# Altium footprint library 二极管封装库.PcbLib: 222 footprints (part 6 of 14)
Each footprint in its own frame and in the unit in brackets; x right, y up, seen from the top. Pads: shape width x height; smd on the part's side, far side on the other; paste and mask are expansions set on the pad; w line width, h text height; cw(c..) or ccw(c..) is an arc to the next point about the centre after c.
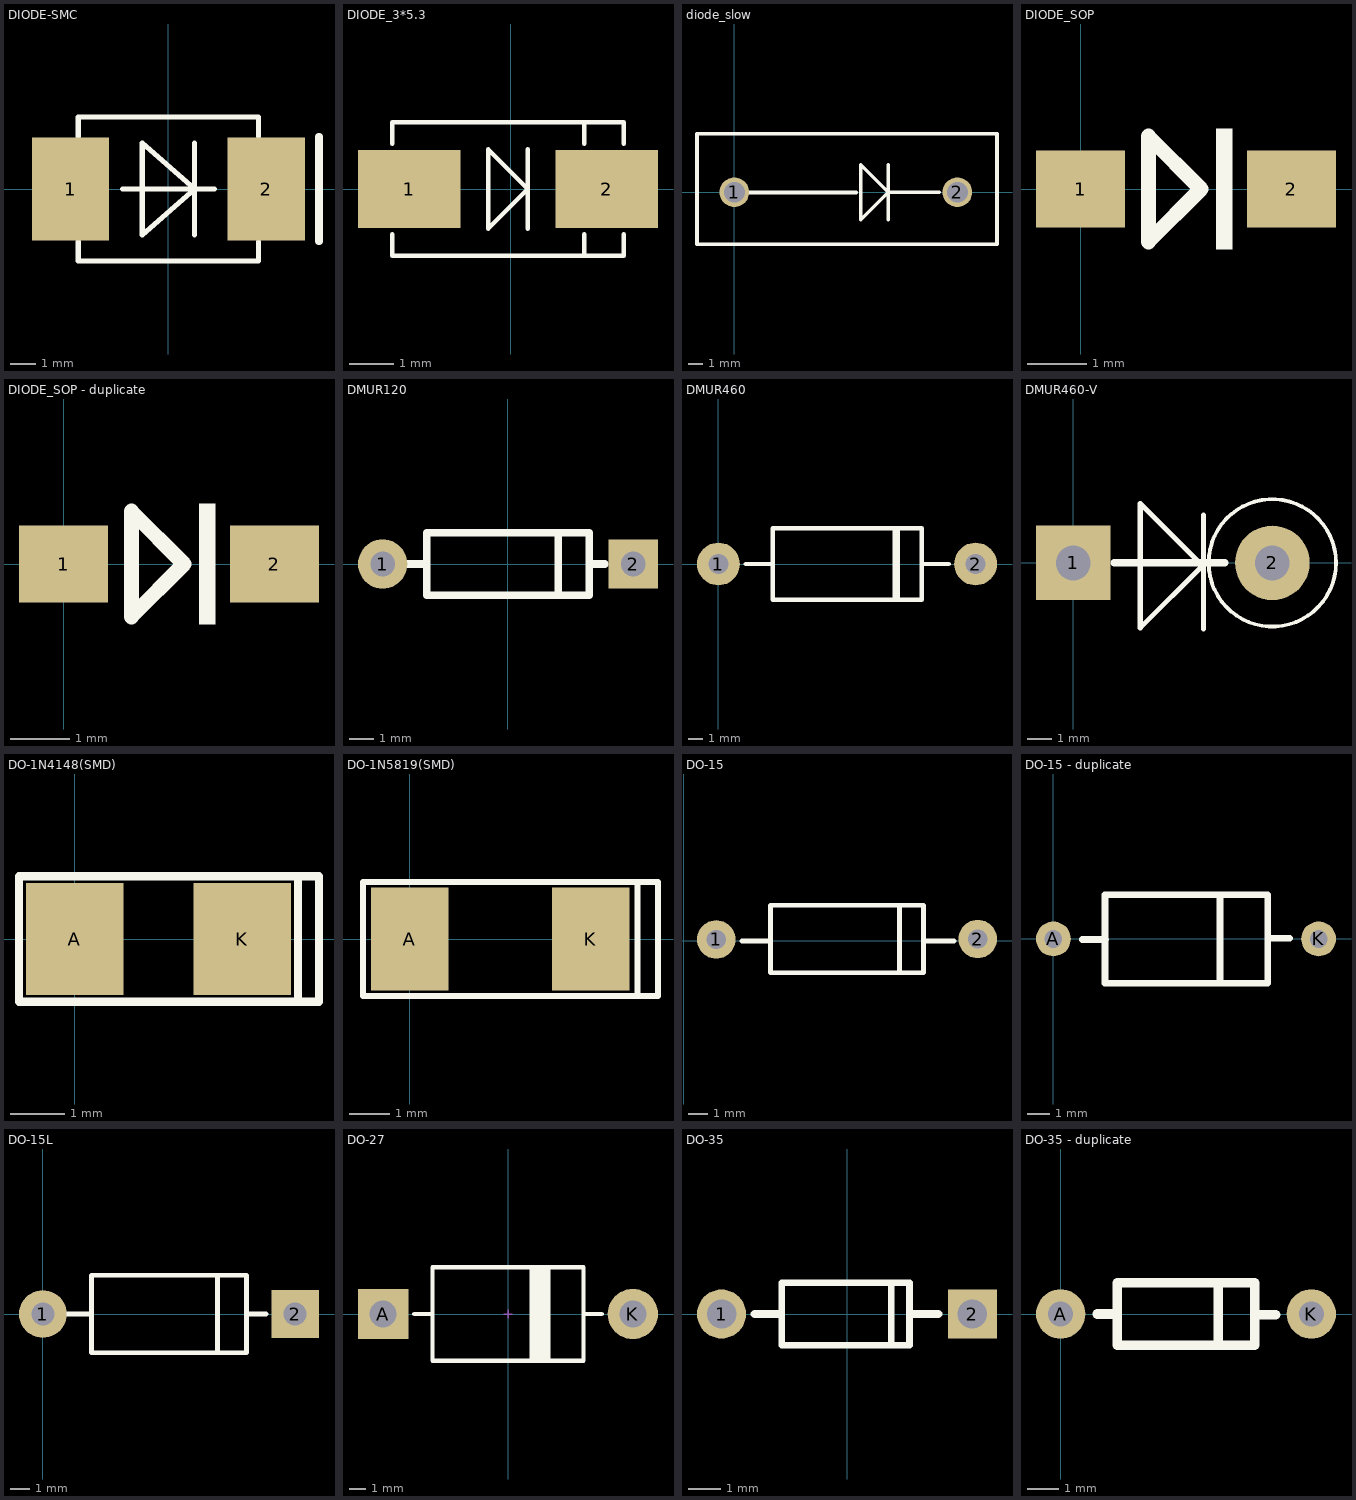
[diagram p5: the footprints below, top view; thin cyan lines are the x and y axes]

## DIODE-SMC [mm] "贴片二极管"
height 1.5
pads (2):
  rect 3x4 smd: 1(-3.8,0) 2(3.8,0)
Top Overlay:
  lines w0.2: -3.5,-2.032 -3.5,-2.794 3.5,-2.794 3.5,-2.032 ; -3.5,2.032 -3.5,2.794 3.5,2.794 3.5,2.032 ; -1.778,0 1.778,0 ; 1.016,-1.778 1.016,1.778 ; -1.016,-1.778 -1.016,1.778 1.016,0 -1.016,-1.778
  lines w0.3: 5.842,-2.032 5.842,2.032
3D body: height 0.8, standoff 0, extent -3.81,-1.905 -3.429,1.905
3D body: height 0.8, standoff 0, extent 3.556,-1.905 3.937,1.905
3D body: height 1, standoff 0, extent -3.429,-2.794 3.556,2.794
3D body: height 1.05, standoff 1, extent 2.921,-2.794 3.429,2.794

## DIODE_3*5.3 [mm]
pads (2):
  rect 2.3x1.75 smd: 1(-2.286,0) 2(2.159,0)
Top Overlay:
  lines w0.1: -2.667,-1.016 -2.667,-1.5 2.54,-1.5 2.54,-1.016 ; -2.667,1.016 -2.667,1.5 2.54,1.5 2.54,1.016 ; 0.381,-0.889 0.381,0.889 ; 1.651,-1.5 1.651,-1.016 ; 1.651,1.016 1.651,1.5 ; -0.508,-0.889 0.381,0 -0.508,0.889 -0.508,-0.889

## diode_slow [mm]
pads (2):
  round 2 hole 1.4: 1(0,0) 2(15.011,0)
Top Overlay:
  lines w0.254: 1.016,-0.025 8.179,-0.025 ; 10.363,-1.854 10.363,1.854 ; 13.767,0 10.363,0 ; 10.363,0 8.509,-1.854 8.509,1.854 10.363,0 ; -2.515,-3.505 17.678,-3.505 17.678,3.937 -2.515,3.937 -2.515,-3.505

## DIODE_SOP [mm]
pads (2):
  rect 1.5x1.3 smd: 1(0,0) 2(3.556,0)
Top Overlay:
  rectangle: 2.286,-1.016 2.559,1.016
  lines w0.254: 1.143,-0.889 2.032,0 1.143,0.889 1.143,-0.889

## DIODE_SOP - duplicate [mm]
pads (2):
  rect 1.5x1.3 smd: 1(0,0) 2(3.556,0)
Top Overlay:
  rectangle: 2.286,-1.016 2.559,1.016
  lines w0.254: 1.143,-0.889 2.032,0 1.143,0.889 1.143,-0.889

## DMUR120 [mm]
pads (2):
  round 2 hole 1: 1(-5.08,0)
  rect 2x2 hole 1: 2(5.08,0)
Top Overlay:
  lines w0.305: -4.064,0 -3.302,0 ; 2.032,-1.27 2.032,1.27 ; 3.302,0 3.92,0 ; -3.302,-1.27 -3.302,1.27 3.302,1.27 3.302,-1.27 -3.302,-1.27

## DMUR460 [mm]
pads (2):
  round 3 hole 1.4: 1(0,0) 2(18,0)
Top Overlay:
  rectangle: 12.192,-2.5 12.7,2.5
  lines w0.305: 1.905,0 3.81,0 ; 14.224,0 16.129,0 ; 3.81,-2.5 3.81,2.5 14.224,2.5 14.224,-2.5 3.81,-2.5

## DMUR460-V [mm]
pads (2):
  rect 3x3 hole 1.4: 1(0,0)
  round 3 hole 1.4: 2(8,0)
Top Overlay:
  circle w0.15: c8,0 r2.561
  lines w0.203: 5.232,-2.652 5.232,1.92 ; 2.692,-2.612 2.692,2.388 5.192,-0.112 2.692,-2.612
  lines w0.305: 1.651,0 6.096,0

## DO-1N4148(SMD) [mil]
pads (2):
  rect 70x80 smd: A(0,0) K(120,0)
Top Overlay:
  lines w5.91: 160,-45 160,45 ; -40,-45 -40,45 175,45 175,-45 -40,-45
3D body "1N4148(SMD).step": height 55.12, standoff 0, extent -8.9,-27.56 128.9,27.56

## DO-1N5819(SMD) [mil]
pads (2):
  rect 75x100 smd: A(0,0) K(175,0)
Top Overlay:
  lines w5.91: 220,-55 220,55 ; -45,-55 240,-55 240,55 -45,55 -45,-55
3D body "User Library-DO-214AC SMA.step": height 94.69, standoff 0, extent -14.86,-51.18 189.86,51.18

## DO-15 [mm] "DO-15"
pads (2):
  round 2 hole 1: 1(1.676,0.076) 2(15.265,0.102)
Top Overlay:
  lines w0.254: 3.023,0 4.445,0 ; 11.201,-1.651 11.201,1.854 ; 11.709,-1.651 11.735,-1.651 ; 12.522,0 14.046,0 ; 4.496,-1.651 12.446,-1.651 12.446,1.854 4.496,1.854 4.496,-1.651
3D body "DO-15.step": height 4.78, standoff -1, extent 1.245,-1.676 15.705,1.889

## DO-15 - duplicate [mil]
pads (2):
  round 62 hole 31.5: A(0,0) K(472.44,0)
Top Overlay:
  lines w12: 51.18,-1 93,-1 ; 92,-78.74 381.89,-78.74 ; 92,-78 92,78.48 ; 92,78.74 381.89,78.74 ; 297,-78.74 297,78.74 ; 382,-79 382,78.48 ; 388,1 421.26,1

## DO-15L [mm]
pads (2):
  round 2.5 hole 1.2: 1(0,0)
  rect 2.5x2.5 hole 1.2: 2(13.208,0)
Top Overlay:
  lines w0.254: 1.016,0 2.54,0 ; 2.54,-1.016 2.54,1.016 ; 9.144,-2.032 9.144,2.032 ; 10.668,0 11.684,0 ; 2.54,-2.032 2.54,-1.524 2.54,2.032 10.668,2.032 10.668,-2.032 2.54,-2.032

## DO-27 [mm] "5.2*14.9mm(直径，脚距）"
pads (2):
  rect 3x3 hole 1.6: A(-7.45,0)
  round 3 hole 1.6: K(7.45,0)
Top Overlay:
  rectangle: 1.27,-2.794 2.54,2.794
  lines w0.254: -5.588,0 -4.572,0 ; 4.572,0 5.588,0 ; -4.5,-2.794 4.5,-2.794 4.5,2.794 -4.5,2.794 -4.5,-2.794
Mechanical 15:
  lines w0.076: -0.254,0 0.254,0 ; 0,-0.254 0,0.254
3D body "DO-27.STEP": height 5.25, standoff -3.46, extent -8.1,-2.601 8.1,2.601

## DO-35 [mm] "DO-204AH"
pads (2):
  round 1.5 hole 0.9: 1(-3.835,0)
  rect 1.5x1.5 hole 0.9: 2(3.835,0)
Top Overlay:
  lines w0.2: 1.352,-0.95 1.352,0.95 ; 1.899,-0.95 -2.001,-0.95 -2.001,0.95 1.899,0.95 ; 1.911,-0.95 1.911,0.95
  lines w0.254: -2.819,0 -2.026,0 ; 1.956,0 2.794,0
3D body "1N4007.STEP": height 3.33, standoff -1, extent -4.216,-1.321 4.191,1.346

## DO-35 - duplicate [mil]
pads (2):
  round 62 hole 31.5: A(0,0) K(314.96,0)
Top Overlay:
  lines w12: 46,0 71,0 ; 198,-39.37 198,39.37 ; 245,-1 270,-1 ; 71,-39.37 71,39.37 244,39.37 244,-39.37 71,-39.37